# Altium footprint library Conectores.PcbLib: 122 footprints (part 7 of 8)
Each footprint in its own frame and in the unit in brackets; x right, y up, seen from the top. Pads: shape width x height; smd on the part's side, far side on the other; paste and mask are expansions set on the pad; w line width, h text height; cw(c..) or ccw(c..) is an arc to the next point about the centre after c.
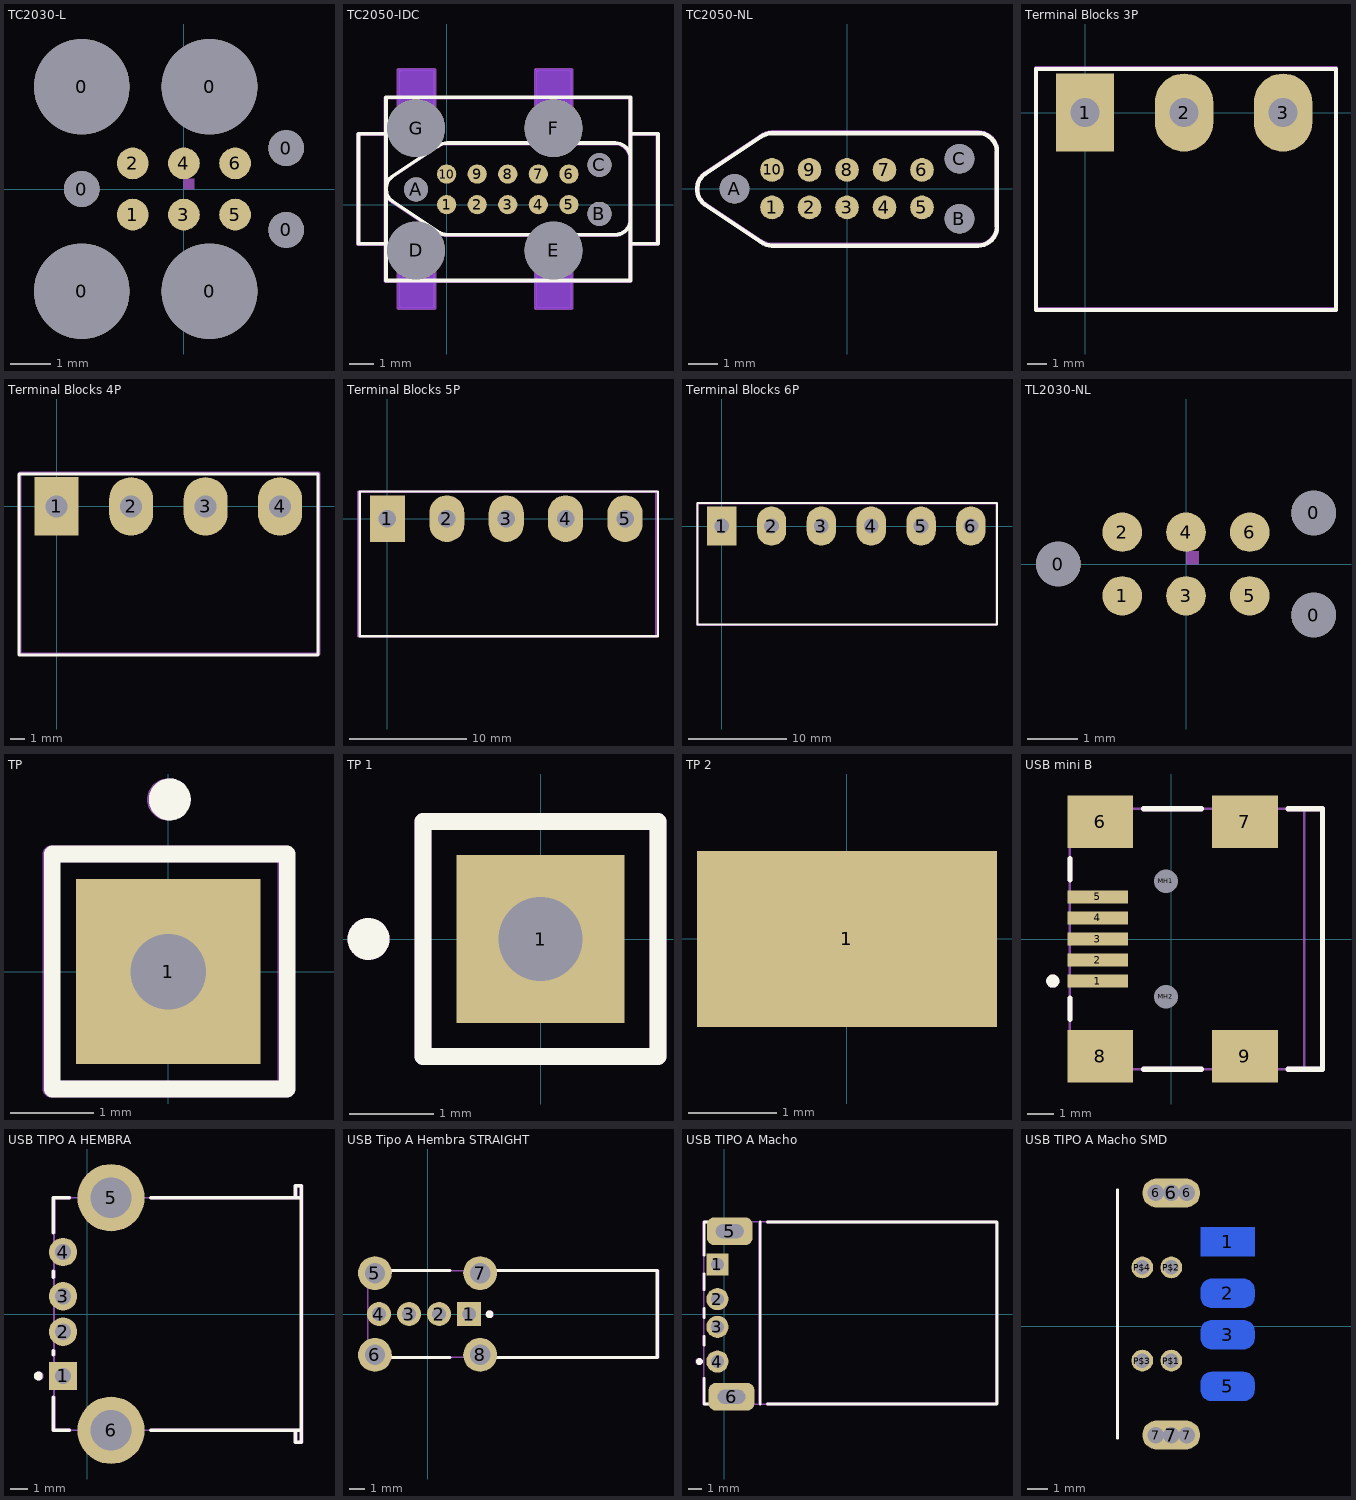
[diagram p6: the footprints below, top view; thin cyan lines are the x and y axes]

## TC2030-L [mil]
pads (13):
  round 93.5 hole 93.5: 0(-100,-100) 0(-100,100) 0(25,-100) 0(25,100)
  round 35 hole 35: 0(-100,0) 0(100,-40) 0(100,40)
  rrect100% 31x31 smd: 1(-50,-25) 2(-50,25) 3(0,-25) 4(0,25) 5(50,-25) 6(50,25)
Mechanical 27:
  region: 0,0 10,0 10,10 0,10

## TC2050-IDC [mm]
pads (17):
  round 0.8 smd paste-0.9: 1(0,0) 2(1.27,0) 3(2.54,0) 4(3.81,0) 5(5.08,0) 6(5.08,1.27) 7(3.81,1.27) 8(2.54,1.27) 9(1.27,1.27) 10(0,1.27)
  round 1 hole 1 paste-1.1: A(-1.27,0.635) B(6.35,-0.381) C(6.35,1.651)
  round 2.4 hole 2.4 paste-2.5: D(-1.27,-1.905) E(4.445,-1.905) F(4.445,3.175) G(-1.27,3.175)
Bottom Layer keep-out:
  region: -2,-4.3 -0.5,-4.3 -0.5,-2.8 -2,-2.8
  region: 3.7,-4.3 5.2,-4.3 5.2,-2.8 3.7,-2.8
  region: -2,4.1 -0.5,4.1 -0.5,5.6 -2,5.6
  region: 3.7,4.1 5.2,4.1 5.2,5.6 3.7,5.6
Top Overlay:
  lines w0.152: -2.52,-1.758 -2.52,2.941 ; 7.64,-0.615 cw(c7.005,-0.615) 7.005,-1.25 0.02,-1.25 cw(c0.02,-0.615) -0.361,-1.123 -2.266,0.147 cw(c-1.885,0.655) -2.266,1.163 -0.361,2.433 cw(c0.02,1.925) 0.02,2.56 7.005,2.56 cw(c7.005,1.925) 7.64,1.925 ; -2.52,2.941 -2.52,4.465 7.64,4.465 7.64,2.941 ; -2.52,2.941 -3.663,2.941 -3.663,-1.631 -2.52,-1.631 -2.52,-3.155 7.64,-3.155 7.64,-1.631 ; 7.64,-1.631 8.656,-1.631 8.783,-1.631 8.783,2.941 7.64,2.941 ; 7.64,-1.631 7.64,2.941
Mechanical 1:
  lines w0.152: -2.54,-1.651 -3.683,-1.651 -3.683,2.921 -2.54,2.921 ; 7.62,-1.651 8.763,-1.651 8.763,2.921 7.62,2.921 ; 7.62,-0.635 cw(c6.985,-0.635) 6.985,-1.27 0,-1.27 cw(c0,-0.635) -0.381,-1.143 -2.286,0.127 cw(c-1.905,0.635) -2.286,1.143 -0.381,2.413 cw(c0,1.905) 0,2.54 6.985,2.54 cw(c6.985,1.905) 7.62,1.905 ; -2.54,-3.175 -2.54,4.445 7.62,4.445 7.62,0.635 7.62,-3.175 -2.54,-3.175 ; -2,-4.3 -2,-2.8 -0.5,-2.8 -0.5,-4.3 -2,-4.3 ; -2,4.1 -2,5.6 -0.5,5.6 -0.5,4.1 -2,4.1 ; 3.7,-4.3 5.2,-4.3 5.2,-2.8 3.7,-2.8 3.7,-4.3 ; 3.7,4.1 3.7,5.6 5.2,5.6 5.2,4.1 3.7,4.1
Mechanical 29:
  lines w0.152: -2.54,-1.778 -2.54,2.921 ; 7.62,-0.635 cw(c6.985,-0.635) 6.985,-1.27 0,-1.27 cw(c0,-0.635) -0.381,-1.143 -2.286,0.127 cw(c-1.905,0.635) -2.286,1.143 -0.381,2.413 cw(c0,1.905) 0,2.54 6.985,2.54 cw(c6.985,1.905) 7.62,1.905 ; -2.54,2.921 -3.683,2.921 -3.683,-1.651 -2.54,-1.651 -2.54,-3.175 7.62,-3.175 7.62,-1.651 ; -2.54,2.921 -2.54,4.445 7.62,4.445 7.62,2.921 ; 7.62,-1.651 7.62,2.921 ; 7.62,-1.651 8.636,-1.651 8.763,-1.651 8.763,2.921 7.62,2.921

## TC2050-NL [mm]
pads (13):
  round 0.8 smd paste-0.9: 1(-2.54,-0.635) 2(-1.27,-0.635) 3(0,-0.635) 4(1.27,-0.635) 5(2.54,-0.635) 6(2.54,0.635) 7(1.27,0.635) 8(0,0.635) 9(-1.27,0.635) 10(-2.54,0.635)
  round 1 hole 1 paste-1.1: A(-3.81,0) B(3.81,-1.016) C(3.81,1.016)
Top Overlay:
  lines w0.152: -4.826,-0.528 cw(c-4.445,-0.02) -4.826,0.488 -2.921,1.758 cw(c-2.54,1.25) -2.54,1.885 4.445,1.885 cw(c4.445,1.25) 5.08,1.25 5.08,-1.29 cw(c4.445,-1.29) 4.445,-1.925 -2.54,-1.925 cw(c-2.54,-1.29) -2.921,-1.798 -4.826,-0.528
Mechanical 1:
  lines w0.152: 5.08,-1.27 cw(c4.445,-1.27) 4.445,-1.905 -2.54,-1.905 cw(c-2.54,-1.27) -2.921,-1.778 -4.826,-0.508 cw(c-4.445,0) -4.826,0.508 -2.921,1.778 cw(c-2.54,1.27) -2.54,1.905 4.445,1.905 cw(c4.445,1.27) 5.08,1.27
Mechanical 29:
  lines w0.152: -4.826,-0.508 cw(c-4.445,0) -4.826,0.508 -2.921,1.778 cw(c-2.54,1.27) -2.54,1.905 4.445,1.905 cw(c4.445,1.27) 5.08,1.27 5.08,-1.27 cw(c4.445,-1.27) 4.445,-1.905 -2.54,-1.905 cw(c-2.54,-1.27) -2.921,-1.778 -4.826,-0.508

## Terminal Blocks 3P [mm] "Terminal Blocks 3 Position"
pads (3):
  rect 3x4 hole 1.5: 1(0,0)
  oval 3x4 hole 1.5: 2(5.08,0) 3(10.16,0)
Top Overlay:
  lines w0.2: -2.515,-10.134 12.878,-10.134 12.878,2.236 -2.515,2.236 -2.515,-10.134
Mechanical 29:
  lines w0.2: -2.515,-10.084 -2.515,2.286 12.878,2.286 12.878,-10.084 -2.515,-10.084
  text "'.Designator'" at -1.948,-9.592 h0.5
  text "1" at -0.11,-3.4 h0.8
3D body "User Library-MSTB 2,5-3-G-5,08 1759020.STEP": height 8.6, standoff -3.5, extent -2.54,-9.989 12.7,2.013

## Terminal Blocks 4P [mm] "Terminal Blocks 4 Position"
pads (4):
  rect 3x4 hole 1.5: 1(0,0)
  oval 3x4 hole 1.5: 2(5.08,0) 3(10.16,0) 4(15.24,0)
Top Overlay:
  lines w0.2: -2.575,-10.144 17.84,-10.144 17.84,2.226 -2.575,2.226 -2.575,-10.144
Mechanical 29:
  lines w0.2: -2.515,-10.084 -2.515,2.286 17.9,2.286 17.9,-10.084 -2.515,-10.084
  text "1" at -0.06,-3.48 h0.8
  text "'.Designator'" at -1.888,-9.542 h0.5
3D body "User Library-MSTB 2,5-4-G-5,08 1759033.STEP": height 8.6, standoff -3.5, extent -2.52,-10.001 17.8,2.001

## Terminal Blocks 5P [mm] "Terminal Blocks 5 Position"
pads (5):
  rect 3x4 hole 1.5: 1(0,0)
  oval 3x4 hole 1.5: 2(5.08,0) 3(10.16,0) 4(15.24,0) 5(20.32,0)
Top Overlay:
  lines w0.2: -2.375,-10.044 -2.375,2.326 23.14,2.326 23.14,-10.044 -2.375,-10.044
Mechanical 29:
  lines w0.2: -2.515,-10.084 23,-10.084 23,2.286 -2.515,2.286 -2.515,-10.084
  text "'.Designator'" at -1.988,-9.512 h0.5
  text "1" at 0.03,-3.45 h0.8
3D body "User Library-MSTB 2,5-5-G-5,08 1759046.STEP": height 8.6, standoff -3.5, extent -2.5,-9.902 22.9,2.1

## Terminal Blocks 6P [mm] "Terminal Blocks 6 Position"
pads (6):
  rect 3x4 hole 1.5: 1(0,0)
  oval 3x4 hole 1.5: 2(5.08,0) 3(10.16,0) 4(15.24,0) 5(20.32,0) 6(25.4,0)
Top Overlay:
  lines w0.2: -2.475,-10.014 -2.475,2.356 28.056,2.356 28.056,-10.014 -2.475,-10.014
Mechanical 29:
  lines w0.2: -2.515,-10.084 28.016,-10.084 28.016,2.286 -2.515,2.286 -2.515,-10.084
  text "'.Designator'" at -1.818,-9.462 h0.5
  text "1" at 0.02,-3.54 h0.8
3D body "User Library-MSTB 2,5-6-G-5,08 1759059.STEP": height 8.6, standoff -3.5, extent -2.591,-10.014 27.889,1.988

## TL2030-NL [mil]
pads (9):
  round 35 hole 35: 0(-100,0) 0(100,-40) 0(100,40)
  rrect100% 31x31 smd: 1(-50,-25) 2(-50,25) 3(0,-25) 4(0,25) 5(50,-25) 6(50,25)
Mechanical 27:
  region: 0,0 10,0 10,10 0,10

## TP [mm] "Test Point"
pads (1):
  rect 2.2x2.2 hole 0.9: 1(0,0)
Top Overlay:
  circle w0.25: c0.02,2.05 r0.125
  lines w0.2: -1.38,-1.4 1.42,-1.4 1.42,1.4 -1.38,1.4 -1.38,-1.4
Mechanical 29:
  circle w0.25: c0,2.05 r0.125
  lines w0.2: -1.4,-1.4 -1.4,1.4 1.4,1.4 1.4,-1.4 -1.4,-1.4
  text "'.Designator'" at -0.888,-2.192 h0.5
3D body "TEST POINT.step": height 6.5, standoff -3, extent -0.508,-0.492 0.492,0.508

## TP 1 [mm] "Test Point True Hole"
pads (1):
  rect 2x2 hole 1: 1(0,0)
Top Overlay:
  circle w0.25: c-2.05,0 r0.125
  lines w0.2: -1.4,-1.4 1.4,-1.4 1.4,1.4 -1.4,1.4 -1.4,-1.4
Mechanical 29:
  circle w0.25: c-2.05,0 r0.125
  lines w0.2: -1.4,-1.4 -1.4,1.4 1.4,1.4 1.4,-1.4 -1.4,-1.4
  text "'.Designator'" at -0.348,-2.212 h0.5
3D body "TEST POINT 1.step": height 6.5, standoff -3, extent -0.551,-0.483 0.449,0.517

## TP 2 [mm] "5016KCT-ND"
pads (1):
  rect 3.4x2 smd: 1(0,0)
Mechanical 29:
  text "'.Designator'" at -0.418,-1.802 h0.5
3D body "Test point Keystone smt 5015.step": height 2, standoff 0, extent -1.426,-0.568 1.477,0.432

## USB mini B [mm]
pads (11):
  rect 2.3x0.5 smd: 1(-2.8,-1.6) 2(-2.8,-0.8) 3(-2.8,0) 4(-2.8,0.8) 5(-2.8,1.6)
  rect 2.5x2 smd: 6(-2.7,4.45) 7(2.8,4.45) 8(-2.7,-4.45) 9(2.8,-4.45)
  round 0.6 hole 0.9 unplated: MH1(-0.2,2.2) MH2(-0.2,-2.2)
Top Overlay:
  circle w0.25: c-4.5,-1.6 r0.125
  lines w0.2: -3.85,-3.05 -3.85,-2.25 ; -3.85,2.25 -3.85,3.05 ; -1.05,-4.95 1.15,-4.95 ; -1.05,4.95 1.15,4.95 ; 4.45,-4.95 5.75,-4.95 5.75,4.95 4.45,4.95
Mechanical 1:
  lines w0.1: 5.05,-4.95 5.05,4.95
  text "PCB Edge" at 5.482,-4.036 h0.25
Mechanical 13:
  lines w0.1: -3.85,-4.95 -3.85,4.95 5.75,4.95 5.75,-4.95 -3.85,-4.95
Mechanical 29:
  circle w0.25: c-4.5,-1.6 r0.125
  lines w0.2: -3.85,-3.05 -3.85,-2.25 ; -3.85,2.25 -3.85,3.05 ; -1.05,-4.95 1.15,-4.95 ; -1.05,4.95 1.15,4.95 ; 4.45,-4.95 5.75,-4.95 5.75,4.95 4.45,4.95
  text "'.Designator'" at -0.898,-0.212 h0.5
3D body "USB_mini_B.step": height 3.95, standoff -1, extent -3.466,-5.375 5.734,5.325

## USB TIPO A HEMBRA [mm]
pads (6):
  rect 1.6x1.6 hole 0.92: 1(-1.355,-3.5)
  round 1.6 hole 0.92: 2(-1.355,-1) 3(-1.355,1) 4(-1.355,3.5)
  round 3.8 hole 2.3: 5(1.355,6.57) 6(1.355,-6.57)
Top Overlay:
  circle w0.25: c-2.755,-3.5 r0.125
  lines w0.2: -1.915,-4.7 -1.915,-6.565 -0.995,-6.565 ; -1.915,-2.3 -1.915,-2.09 ; -1.915,2.09 -1.915,2.41 ; -1.915,4.59 -1.915,6.565 -0.995,6.565 ; 3.605,-6.565 12.085,-6.565 ; 3.605,6.565 12.085,6.565 ; 11.765,-6.565 11.765,-7.25 12.085,-7.25 12.085,-6.565 ; 11.765,6.565 11.765,7.25 12.085,7.25 12.085,6.565 ; 12.085,-6.565 12.085,6.565
Mechanical 13:
  lines w0.1: -1.865,-6.565 -1.865,6.565 11.815,6.565 11.815,7.25 12.135,7.25 12.135,-7.25 11.815,-7.25 11.815,-6.565 -1.865,-6.565
Mechanical 29:
  circle w0.25: c-2.705,-3.5 r0.125
  lines w0.2: -1.865,-4.7 -1.865,-6.565 -0.945,-6.565 ; -1.865,-2.3 -1.865,-2.09 ; -1.865,2.09 -1.865,2.41 ; -1.865,4.59 -1.865,6.565 -0.945,6.565 ; 3.655,-6.565 12.135,-6.565 ; 3.655,6.565 12.135,6.565 ; 11.815,-6.565 11.815,-7.25 12.135,-7.25 12.135,-6.565 ; 11.815,6.565 11.815,7.25 12.135,7.25 12.135,6.565 ; 12.135,-6.565 12.135,6.565
  text "'.Designator'" at 3.577,-0.192 h0.5
3D body "USBR-A-S-S-O-TH.step": height 7.75, standoff -3.1, extent -2.422,-7.844 11.738,7.956

## USB Tipo A Hembra STRAIGHT [mm] "FCI 73725-0110BLF"
pads (8):
  rect 1.6x1.6 hole 0.92: 1(2.77,0)
  round 1.6 hole 0.92: 2(0.77,0) 3(-1.23,0) 4(-3.23,0)
  round 2.25 hole 1.35: 5(-3.5,2.72) 6(-3.5,-2.72) 7(3.5,2.72) 8(3.5,-2.72)
Top Overlay:
  circle w0.25: c4.12,-0.02 r0.125
  lines w0.2: -2.5,-2.88 1.48,-2.88 ; -2.5,2.88 1.48,2.88 ; 4.5,-2.88 15.28,-2.88 15.28,2.88 4.5,2.88
Mechanical 13:
  lines w0.1: -3.96,-2.88 15.33,-2.88 15.33,2.88 -3.96,2.88 -3.96,-2.88
Mechanical 29:
  circle w0.25: c4.17,-0.02 r0.125
  lines w0.2: -2.45,-2.88 1.53,-2.88 ; -2.45,2.88 1.53,2.88 ; 4.55,-2.88 15.33,-2.88 15.33,2.88 4.55,2.88
  text "'.Designator'" at 5.062,-0.282 h0.5
3D body "USB-STRT-CONN.step": height 14.6, standoff -0.87, extent -4.244,-3.495 15.106,3.505

## USB TIPO A Macho [mm] "Conector USB tipo A macho"
pads (6):
  rect 1.6x1.6 hole 0.92: 1(-0.508,3.571)
  round 1.6 hole 0.92: 2(-0.508,1.071) 3(-0.508,-0.929) 4(-0.508,-3.429)
  rrect50% 3.3x2 hole 1 slot 2 at 0 deg: 5(0.381,5.969) 6(0.508,-5.969)
Top Overlay:
  circle w0.25: c-1.808,-3.429 r0.125
  lines w0.2: -1.458,-4.629 -1.458,-6.494 -1.008,-6.494 ; -1.458,-2.229 -1.458,-1.599 ; -1.458,-0.259 -1.458,0.401 ; -1.458,1.741 -1.458,2.901 ; -1.458,4.241 -1.458,6.636 -1.008,6.636 ; 2.572,-6.494 2.572,6.636 ; 3.092,-6.494 19.654,-6.494 19.654,6.636 3.092,6.636
Mechanical 1:
  text "PCB Edge" at 12.156,-6.232 h0.25
Mechanical 13:
  lines w0.1: 12.172,-6.494 -1.508,-6.494 -1.508,6.636 12.172,6.636
Mechanical 29:
  circle w0.25: c-1.858,-3.429 r0.125
  lines w0.2: -1.508,-4.629 -1.508,-6.494 -1.058,-6.494 ; -1.508,-2.229 -1.508,-1.599 ; -1.508,-0.259 -1.508,0.401 ; -1.508,1.741 -1.508,2.901 ; -1.508,4.241 -1.508,6.636 -1.058,6.636 ; 2.522,-6.494 2.522,6.636 ; 3.042,-6.494 19.604,-6.494 19.604,6.636 3.042,6.636
  text "'.Designator'" at 3.952,-0.152 h0.5
3D body "USB-AM-S-F-B-TH.step": height 1.18, standoff -4.52, extent -0.635,-6.223 18.115,6.277

## USB TIPO A Macho SMD [mil] "Conector USB tipo A macho SMD (P/N: 0480372200)"
pads (14):
  rect 102.36x55.12 smd far side: 1(663.71,160.99)
  rrect75% 102.36x55.12 smd far side: 2(663.71,62.56) 3(663.71,-16.18) 5(663.71,-114.61)
  round 31.5 hole 31.5: 6(526.89,253.51) 6(585.95,253.51) 7(526.89,-207.13) 7(585.95,-207.13)
  oval 110.24x55.12 hole 31.5: 6(556.42,253.51) 7(556.42,-207.13)
  round 41.34 hole 27.56: P$1(556.42,-65.39) P$2(556.42,111.77) P$3(501.3,-65.39) P$4(501.3,111.77)
Top Overlay:
  lines w5: 454.06,-213.03 454.06,259.41
Mechanical 29:
  text "'.Designator'" at 439.44,-80.62 h19.68
3D body "USB A type male SMT.stp": height 86.59, standoff -141.73, extent -142.52,-219.29 656.69,277